# Altium footprint library ABSDataSystem_PartsLibrary.PcbLib: 50 footprints (part 1 of 4)
Each footprint in its own frame and in the unit in brackets; x right, y up, seen from the top. Pads: shape width x height; smd on the part's side, far side on the other; paste and mask are expansions set on the pad; w line width, h text height; cw(c..) or ccw(c..) is an arc to the next point about the centre after c.
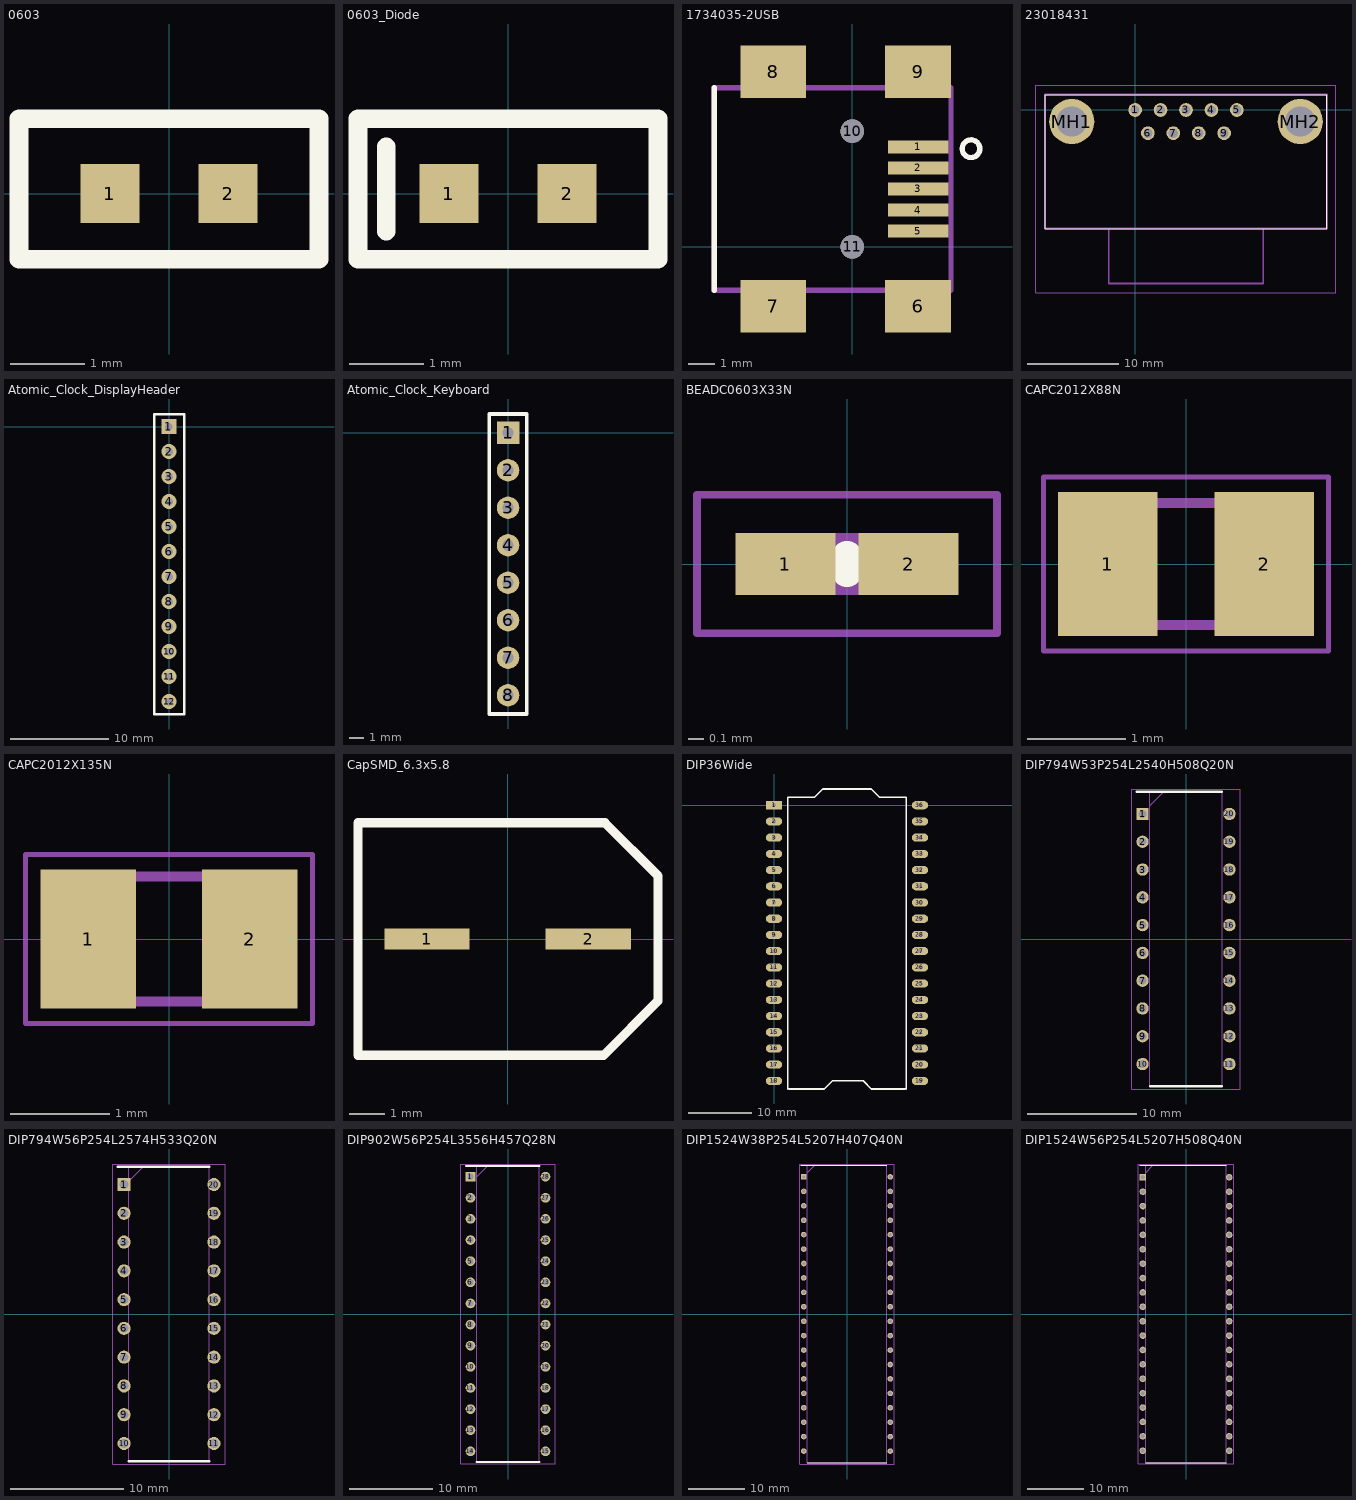
[diagram p0: the footprints below, top view; thin cyan lines are the x and y axes]

## 0603 [mm]
pads (2):
  rect 0.8x0.8 smd: 1(-0.8,0) 2(0.8,0)
Top Overlay:
  lines w0.254: -2.032,-0.889 2.032,-0.889 2.032,1.016 -2.032,1.016 -2.032,-0.889

## 0603_Diode [mm]
pads (2):
  rect 0.8x0.8 smd: 1(-0.8,0) 2(0.8,0)
Top Overlay:
  lines w0.254: -1.651,-0.508 -1.651,0.635 ; -2.032,-0.889 2.032,-0.889 2.032,1.016 -2.032,1.016 -2.032,-0.889

## 1734035-2USB [mm]
pads (11):
  rect 2.3x0.5 smd: 1(2.5,3.8) 2(2.5,3) 3(2.5,2.2) 4(2.5,1.4) 5(2.5,0.6)
  rect 2.5x2 smd: 6(2.5,-2.25) 7(-3,-2.25) 8(-3,6.65) 9(2.5,6.65)
  round 0.9 hole 0.9 unplated: 10(0,4.4) 11(0,0)
Top Overlay:
  circle w0.2: c4.512,3.731 r0.336
  lines w0.2: -5.25,-1.65 -5.25,6.05
Mechanical 13:
  lines w0.2: -5.25,-1.65 -5.25,6.05 3.75,6.05 3.75,-1.65 -5.25,-1.65
3D body "1734035-4.stp": height 4.17, standoff -0.92, extent -6.35,-2.791 2.85,7.109

## 23018431 [mm]
pads (11):
  round 1.5 hole 1: 1(0,0) 2(2.78,0) 3(5.56,0) 4(8.34,0) 5(11.12,0) 6(1.39,-2.54) 7(4.17,-2.54) 8(6.95,-2.54) 9(9.73,-2.54)
  round 4.95 hole 3.3: MH1(-6.935,-1.27) MH2(18.055,-1.27)
Top Overlay:
  lines w0.1: -9.845,-12.97 20.965,-12.97 20.965,1.68 -9.845,1.68 -9.845,-12.97
Mechanical 13:
  lines w0.2: -2.89,-12.97 -2.89,-18.97 14.01,-18.97 14.01,-12.97 ; -9.845,-12.97 20.965,-12.97 20.965,1.68 -9.845,1.68 -9.845,-12.97
Mechanical 15:
  lines w0.1: -10.845,-19.97 21.965,-19.97 21.965,2.68 -10.845,2.68 -10.845,-19.97
3D body "2301843-1.stp": height 13.59, standoff -3.79, extent -9.855,-18.95 20.955,1.7

## Atomic_Clock_DisplayHeader [mil]
pads (12):
  rect 60x60 hole 30: 1(-1,0)
  round 60 hole 30: 2(0,-100) 3(0,-200) 4(0,-300) 5(0,-400) 6(0,-500) 7(0,-600) 8(0,-700) 9(0,-800) 10(0,-900) 11(0,-1000) 12(0,-1100)
Top Overlay:
  lines w10: -60,-1150 60,-1150 60,50 -60,50 -60,-1150

## Atomic_Clock_Keyboard [mil]
pads (8):
  rect 60x60 hole 30: 1(0,0)
  round 60 hole 30: 2(0,-100) 3(0,-200) 4(0,-300) 5(0,-400) 6(0,-500) 7(0,-600) 8(0,-700)
Top Overlay:
  lines w10: -50,-750 50,-750 50,50 -50,50 -50,-750

## BEADC0603X33N [mm]
pads (2):
  rect 0.65x0.4 smd: 1(-0.4,0) 2(0.4,0)
Top Overlay:
  lines w0.2: 0,-0.05 0,0.05
Mechanical 13:
  lines w0.1: -0.3,-0.15 -0.3,0.15 0.3,0.15 0.3,-0.15 -0.3,-0.15
Mechanical 15:
  lines w0.05: -0.975,-0.45 -0.975,0.45 0.975,0.45 0.975,-0.45 -0.975,-0.45
3D body "BK0603HS330-T.stp": height 0.33, standoff 0, extent -0.3,-0.15 0.3,0.15

## CAPC2012X88N [mm]
pads (2):
  rect 1.02x1.47 smd: 1(-0.8,0) 2(0.8,0)
Mechanical 13:
  lines w0.1: -1,-0.625 1,-0.625 1,0.625 -1,0.625 -1,-0.625
Mechanical 15:
  lines w0.05: -1.46,-0.89 1.46,-0.89 1.46,0.89 -1.46,0.89 -1.46,-0.89
3D body "C0805C104K4RACTU.stp": height 0.88, standoff 0, extent -1,-0.625 1,0.625

## CAPC2012X135N [mm]
pads (2):
  rect 0.96x1.39 smd: 1(-0.81,0) 2(0.81,0)
Mechanical 13:
  lines w0.1: -1,-0.625 1,-0.625 1,0.625 -1,0.625 -1,-0.625
Mechanical 15:
  lines w0.05: -1.44,-0.85 1.44,-0.85 1.44,0.85 -1.44,0.85 -1.44,-0.85
3D body "885382207006.stp": height 1.35, standoff 0, extent -1,-0.625 1,0.625

## CapSMD_6.3x5.8 [mm]
pads (2):
  rect 2.4x0.6 smd: 1(-2.273,0) 2(2.273,0)
Top Overlay:
  lines w0.254: -4.216,1.623 -4.216,-3.277 2.707,-3.277 4.239,-1.744 4.239,1.781 2.743,3.277 -4.216,3.277 -4.216,2.489 -4.216,1.626

## DIP36Wide [mm]
pads (36):
  rect 2.54x1.27 hole 0.635: 1(0,0)
  oval 2.54x1.27 hole 0.635: 2(0,-2.54) 3(0,-5.08) 4(0,-7.62) 5(0,-10.16) 6(0,-12.7) 7(0,-15.24) 8(0,-17.78) 9(0,-20.32) 10(0,-22.86) 11(0,-25.4) 12(0,-27.94) 13(0,-30.48) 14(0,-33.02) 15(0,-35.56) 16(0,-38.1) 17(0,-40.64) 18(0,-43.18) 19(22.86,-43.18) 20(22.86,-40.64) 21(22.86,-38.1) 22(22.86,-35.56) 23(22.86,-33.02) 24(22.86,-30.48) 25(22.86,-27.94) 26(22.86,-25.4) 27(22.86,-22.86) 28(22.86,-20.32) 29(22.86,-17.78) 30(22.86,-15.24) 31(22.86,-12.7) 32(22.86,-10.16) 33(22.86,-7.62) 34(22.86,-5.08) 35(22.86,-2.54) 36(22.86,0)
Top Overlay:
  lines w0.254: 2.159,-44.45 2.159,1.27 6.35,1.27 7.62,2.54 15.24,2.54 16.51,1.27 20.701,1.27 20.701,-44.45 ; 2.286,-44.45 7.874,-44.45 9.144,-43.18 13.97,-43.18 15.24,-44.45 20.574,-44.45
3D body "HTIT_WB_32.stp": height 5, standoff 0, extent -1.243,-46.055 24.257,4.145

## DIP794W53P254L2540H508Q20N [mm]
pads (20):
  rect 1.13x1.13 hole 0.73: 1(-3.97,11.43)
  round 1.13 hole 0.73: 2(-3.97,8.89) 3(-3.97,6.35) 4(-3.97,3.81) 5(-3.97,1.27) 6(-3.97,-1.27) 7(-3.97,-3.81) 8(-3.97,-6.35) 9(-3.97,-8.89) 10(-3.97,-11.43) 11(3.97,-11.43) 12(3.97,-8.89) 13(3.97,-6.35) 14(3.97,-3.81) 15(3.97,-1.27) 16(3.97,1.27) 17(3.97,3.81) 18(3.97,6.35) 19(3.97,8.89) 20(3.97,11.43)
Top Overlay:
  lines w0.2: -4.535,13.46 3.3,13.46 ; -3.3,-13.46 3.3,-13.46
Mechanical 13:
  lines w0.1: -3.3,12.19 -2.03,13.46 ; -3.3,-13.46 3.3,-13.46 3.3,13.46 -3.3,13.46 -3.3,-13.46
Mechanical 15:
  lines w0.05: -4.945,-13.71 4.945,-13.71 4.945,13.71 -4.945,13.71 -4.945,-13.71
3D body "SN74LS244N.stp": height 5.08, standoff -3.5, extent -4.102,-12.7 4.102,12.7

## DIP794W56P254L2574H533Q20N [mm]
pads (20):
  rect 1.159x1.159 hole 0.759: 1(-3.969,11.43)
  round 1.159 hole 0.759: 2(-3.969,8.89) 3(-3.969,6.35) 4(-3.969,3.81) 5(-3.969,1.27) 6(-3.969,-1.27) 7(-3.969,-3.81) 8(-3.969,-6.35) 9(-3.969,-8.89) 10(-3.969,-11.43) 11(3.969,-11.43) 12(3.969,-8.89) 13(3.969,-6.35) 14(3.969,-3.81) 15(3.969,-1.27) 16(3.969,1.27) 17(3.969,3.81) 18(3.969,6.35) 19(3.969,8.89) 20(3.969,11.43)
Top Overlay:
  lines w0.2: -4.548,12.992 3.556,12.992 ; -3.556,-12.992 3.556,-12.992
Mechanical 13:
  lines w0.1: -3.556,11.722 -2.286,12.992 ; -3.556,-12.992 3.556,-12.992 3.556,12.992 -3.556,12.992 -3.556,-12.992
Mechanical 15:
  lines w0.05: -4.957,-13.242 4.957,-13.242 4.957,13.242 -4.957,13.242 -4.957,-13.242
3D body "ATTINY2313A-PU.stp": height 5.33, standoff -3.5, extent -4.109,-12.869 4.109,12.869

## DIP902W56P254L3556H457Q28N [mm]
pads (28):
  rect 1.159x1.159 hole 0.759: 1(-4.508,16.51)
  round 1.159 hole 0.759: 2(-4.508,13.97) 3(-4.508,11.43) 4(-4.508,8.89) 5(-4.508,6.35) 6(-4.508,3.81) 7(-4.508,1.27) 8(-4.508,-1.27) 9(-4.508,-3.81) 10(-4.508,-6.35) 11(-4.508,-8.89) 12(-4.508,-11.43) 13(-4.508,-13.97) 14(-4.508,-16.51) 15(4.508,-16.51) 16(4.508,-13.97) 17(4.508,-11.43) 18(4.508,-8.89) 19(4.508,-6.35) 20(4.508,-3.81) 21(4.508,-1.27) 22(4.508,1.27) 23(4.508,3.81) 24(4.508,6.35) 25(4.508,8.89) 26(4.508,11.43) 27(4.508,13.97) 28(4.508,16.51)
Top Overlay:
  lines w0.2: -5.088,17.78 3.784,17.78 ; -3.784,-17.78 3.784,-17.78
Mechanical 13:
  lines w0.1: -3.784,16.51 -2.514,17.78 ; -3.784,-17.78 -3.784,17.78 3.784,17.78 3.784,-17.78 -3.784,-17.78
Mechanical 15:
  lines w0.05: -5.656,-18.03 -5.656,18.03 5.656,18.03 5.656,-18.03 -5.656,-18.03
3D body "AS6C62256A-70PIN.stp": height 4.57, standoff -3.5, extent -4.648,-17.78 4.648,17.78

## DIP1524W38P254L5207H407Q40N [mm]
pads (40):
  rect 0.98x0.98 hole 0.58: 1(-7.62,24.13)
  round 0.98 hole 0.58: 2(-7.62,21.59) 3(-7.62,19.05) 4(-7.62,16.51) 5(-7.62,13.97) 6(-7.62,11.43) 7(-7.62,8.89) 8(-7.62,6.35) 9(-7.62,3.81) 10(-7.62,1.27) 11(-7.62,-1.27) 12(-7.62,-3.81) 13(-7.62,-6.35) 14(-7.62,-8.89) 15(-7.62,-11.43) 16(-7.62,-13.97) 17(-7.62,-16.51) 18(-7.62,-19.05) 19(-7.62,-21.59) 20(-7.62,-24.13) 21(7.62,-24.13) 22(7.62,-21.59) 23(7.62,-19.05) 24(7.62,-16.51) 25(7.62,-13.97) 26(7.62,-11.43) 27(7.62,-8.89) 28(7.62,-6.35) 29(7.62,-3.81) 30(7.62,-1.27) 31(7.62,1.27) 32(7.62,3.81) 33(7.62,6.35) 34(7.62,8.89) 35(7.62,11.43) 36(7.62,13.97) 37(7.62,16.51) 38(7.62,19.05) 39(7.62,21.59) 40(7.62,24.13)
Top Overlay:
  lines w0.2: -8.11,26.16 6.985,26.16 ; -6.985,-26.16 6.985,-26.16
Mechanical 13:
  lines w0.1: -6.985,24.89 -5.715,26.16 ; -6.985,-26.16 6.985,-26.16 6.985,26.16 -6.985,26.16 -6.985,-26.16
Mechanical 15:
  lines w0.05: -8.36,-26.41 8.36,-26.41 8.36,26.41 -8.36,26.41 -8.36,-26.41
3D body "W65C22S6TPG-14.stp": height 4.07, standoff -3.5, extent -7.715,-26.035 7.715,26.035

## DIP1524W56P254L5207H508Q40N [mm]
pads (40):
  rect 1.16x1.16 hole 0.76: 1(-7.62,24.13)
  round 1.16 hole 0.76: 2(-7.62,21.59) 3(-7.62,19.05) 4(-7.62,16.51) 5(-7.62,13.97) 6(-7.62,11.43) 7(-7.62,8.89) 8(-7.62,6.35) 9(-7.62,3.81) 10(-7.62,1.27) 11(-7.62,-1.27) 12(-7.62,-3.81) 13(-7.62,-6.35) 14(-7.62,-8.89) 15(-7.62,-11.43) 16(-7.62,-13.97) 17(-7.62,-16.51) 18(-7.62,-19.05) 19(-7.62,-21.59) 20(-7.62,-24.13) 21(7.62,-24.13) 22(7.62,-21.59) 23(7.62,-19.05) 24(7.62,-16.51) 25(7.62,-13.97) 26(7.62,-11.43) 27(7.62,-8.89) 28(7.62,-6.35) 29(7.62,-3.81) 30(7.62,-1.27) 31(7.62,1.27) 32(7.62,3.81) 33(7.62,6.35) 34(7.62,8.89) 35(7.62,11.43) 36(7.62,13.97) 37(7.62,16.51) 38(7.62,19.05) 39(7.62,21.59) 40(7.62,24.13)
Top Overlay:
  lines w0.2: -8.2,26.225 7.11,26.225 ; -7.11,-26.225 7.11,-26.225
Mechanical 13:
  lines w0.1: -7.11,24.955 -5.84,26.225 ; -7.11,-26.225 -7.11,26.225 7.11,26.225 7.11,-26.225 -7.11,-26.225
Mechanical 15:
  lines w0.05: -8.45,-26.475 -8.45,26.475 8.45,26.475 8.45,-26.475 -8.45,-26.475
3D body "W65C02S6TPG-14.stp": height 5.08, standoff -3.5, extent -7.76,-26.035 7.76,26.035